# Altium footprint library 常用元件封装库.PcbLib: 1310 footprints (part 7 of 83)
Each footprint in its own frame and in the unit in brackets; x right, y up, seen from the top. Pads: shape width x height; smd on the part's side, far side on the other; paste and mask are expansions set on the pad; w line width, h text height; cw(c..) or ccw(c..) is an arc to the next point about the centre after c.
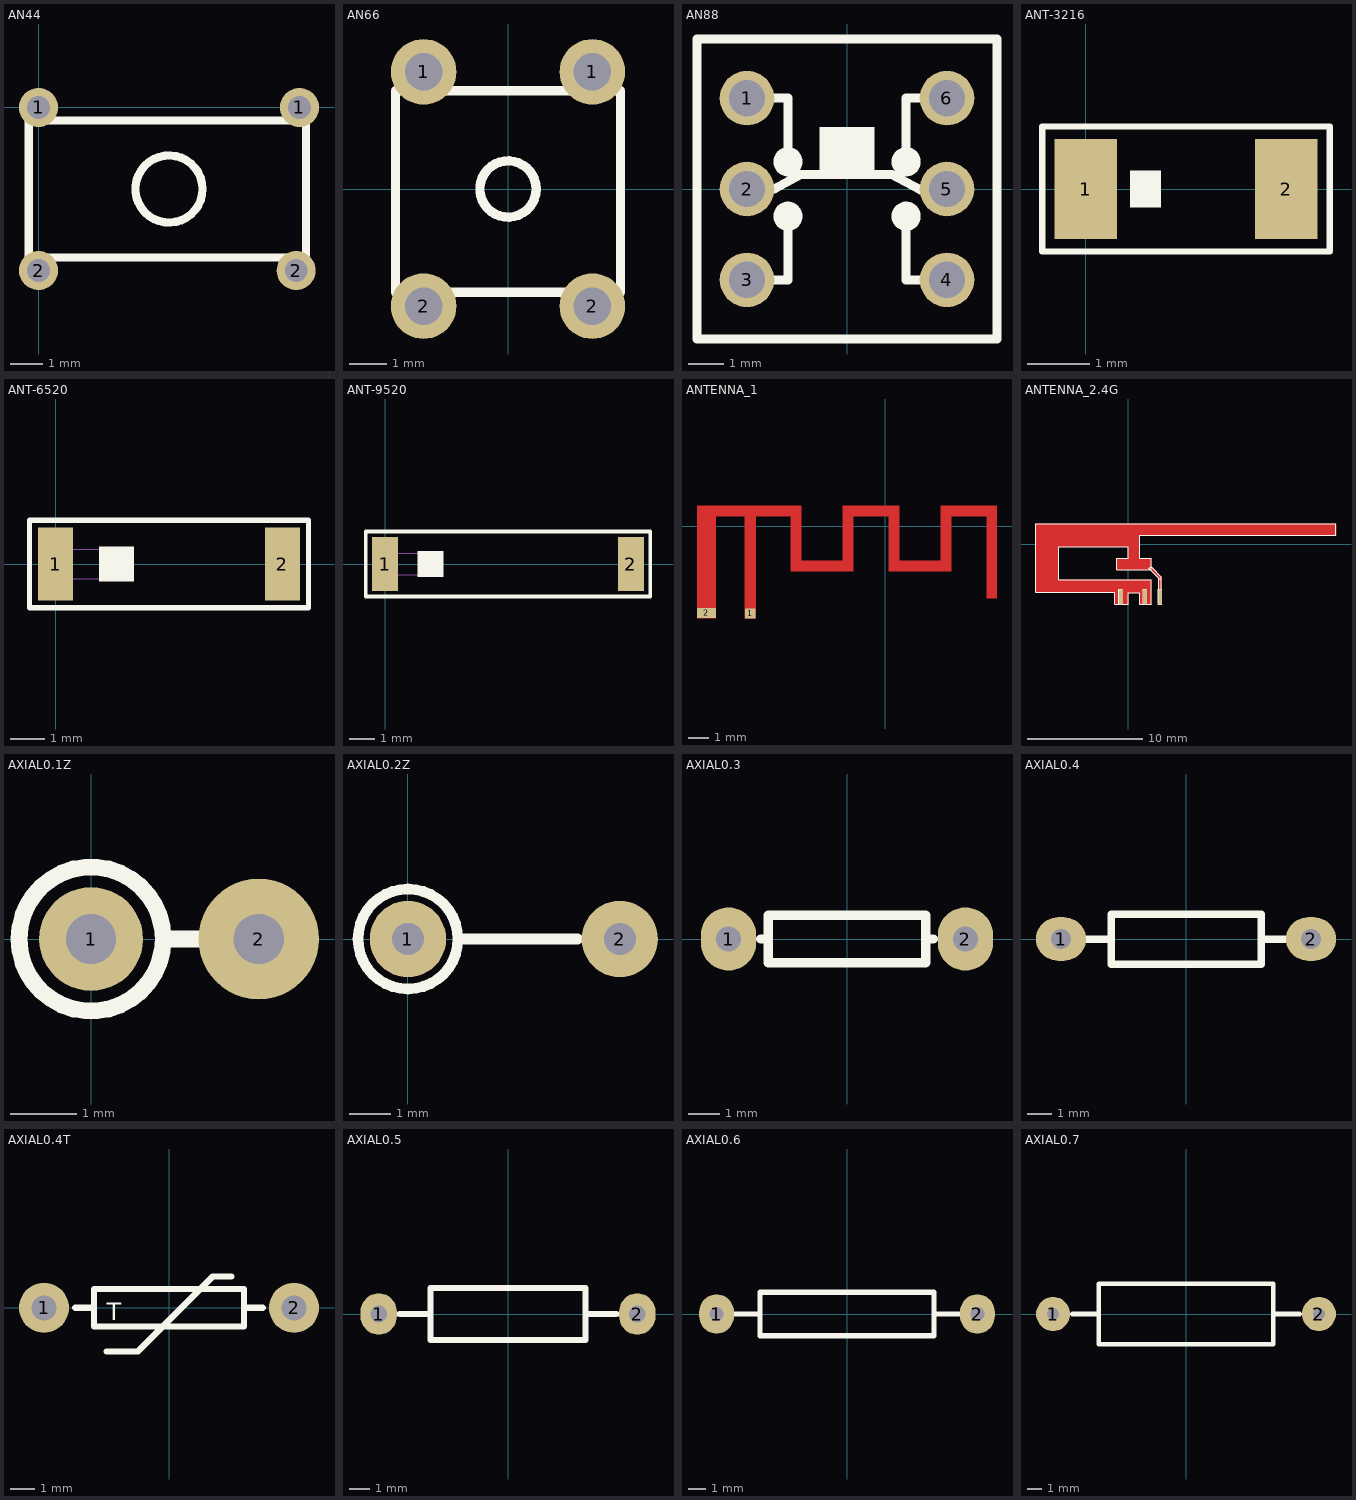
[diagram p6: the footprints below, top view; thin cyan lines are the x and y axes]

## AN44 [mm]
pads (4):
  round 1.2 hole 0.7: 1(0,0) 1(8,0) 2(0,-5) 2(7.9,-5)
Top Overlay:
  circle w0.254: c4,-2.5 r1.03
  lines w0.254: -0.3,-4.6 8.2,-4.6 8.2,-0.4 -0.3,-0.4 -0.3,-4.6

## AN66 [mil]
pads (4):
  round 70 hole 40: 1(-90,125) 1(90,125) 2(-90,-125) 2(90,-125)
Top Overlay:
  circle w10: c0,0 r30
  lines w10: -120,-110 120,-110 120,105 -120,105 -120,-110

## AN88 [mil]
pads (6):
  round 60 hole 40: 1(-110,100) 2(-110,0) 3(-110,-100) 4(110,-100) 5(110,0) 6(110,100)
Top Overlay:
  circle w18: c-65,-30 r7.07
  circle w18: c65,-30 r7.07
  circle w18: c65,30 r7.07
  circle w18: c-65,30 r7.07
  rectangle: -30,16 30,68
  lines w10: -110,-100 -65,-100 -65,-40 ; -110,0 -80,0 -51,16 49,16 81,-1 109,-1 110,0 ; -110,100 -65,100 -65,30 ; 65,-40 65,-100 110,-100 ; 65,40 65,100 110,100 ; -165,-165 165,-165 165,165 -165,165 -165,-165

## ANT-3216 [mm]
pads (2):
  rect 1x1.6 smd: 1(0,0) 2(3.2,0)
Top Overlay:
  rectangle: 0.7,-0.3 1.2,0.3
  lines w0.102: -0.7,-1 -0.7,1 3.9,1 3.9,-1 -0.7,-1

## ANT-6520 [mm]
pads (2):
  rect 1x2.1 smd: 1(0,0) 2(6.5,0)
Top Overlay:
  rectangle: 1.25,-0.5 2.25,0.5
  lines w0.152: -0.75,-1.25 -0.75,1.25 7.25,1.25 7.25,-1.25 -0.75,-1.25
Mechanical 2:
  lines w0.005: -0.432,-0.419 1.448,-0.419 1.448,0.419 -0.432,0.419 -0.432,-0.419

## ANT-9520 [mm]
pads (2):
  rect 1x2.1 smd: 1(0,0) 2(9.5,0)
Top Overlay:
  rectangle: 1.25,-0.5 2.25,0.5
  lines w0.152: -0.75,-1.25 10.25,-1.25 10.25,1.25 -0.75,1.25 -0.75,-1.25
Mechanical 2:
  lines w0.005: -0.432,-0.419 -0.432,0.419 1.448,0.419 1.448,-0.419 -0.432,-0.419

## ANTENNA_1 [mm] "曲流型天线"
pads (2):
  rect 0.5x0.5 smd paste-0.237: 1(-6.477,-4.191)
  rect 0.9x0.5 smd paste-0.437 mask-0.437: 2(-8.583,-4.166)
Top Layer:
  region: -9.033,-4.416 -9.033,0.983 -4.033,0.983 -4.033,-1.653 -2.031,-1.653 -2.031,0.983 0.665,0.983 0.665,-1.658 2.669,-1.658 2.669,0.982 5.367,0.982 5.367,-3.453 4.868,-3.453 4.868,0.474 3.175,0.474 3.175,-2.155 0.16,-2.155 0.16,0.481 -1.529,0.481 -1.529,-2.158 -4.533,-2.158 -4.533,0.481 -6.223,0.481 -6.223,-4.416 -6.733,-4.416 -6.733,0.483 -8.128,0.483 -8.128,-4.416
  region: -2.033,0.484 0.667,0.484 0.667,0.984 -2.033,0.984
  region: -9.033,0.484 -4.033,0.484 -4.033,0.984 -9.033,0.984
  region: 2.667,0.484 5.367,0.484 5.367,0.984 2.667,0.984
  region: -4.533,-2.156 -4.033,-2.156 -4.033,0.51 -4.533,0.51
  region: -4.033,-2.156 -2.033,-2.156 -2.033,-1.651 -4.033,-1.651
  region: -2.033,-2.156 -1.533,-2.156 -1.533,0.51 -2.033,0.51
  region: 2.667,-2.156 3.167,-2.156 3.167,0.51 2.667,0.51
  region: 0.667,-2.156 2.667,-2.156 2.667,-1.651 0.667,-1.651
  region: 0.167,-2.156 0.667,-2.156 0.667,0.51 0.167,0.51
  region: 4.867,-3.456 5.367,-3.456 5.367,0.51 4.867,0.51
  region: -6.733,-4.416 -6.233,-4.416 -6.233,0.51 -6.733,0.51
  region: -9.033,-4.416 -8.133,-4.416 -8.133,0.51 -9.033,0.51

## ANTENNA_2.4G [mil]
pads (3):
  rect 11.81x51.18 smd: 1(108,-180) 2(57,-180) 3(-26,-180)
Top Layer:
  region: 70.47,-84.37 101.61,-115.51 102.64,-118.19 102.76,-118.62 102.76,-205.79 113.23,-205.79 113.23,-112.95 77.56,-77.28
  region: -0.79,-205.51 -46.1,-205.51 -46.1,-163.78 -315.08,-163.78 -315.08,69.96 707.8,69.96 707.8,30.59 38.5,30.59 38.5,-47.99 77.83,-47.99 77.83,-87.36 -40.24,-87.36 -40.24,-48.19 -0.91,-48.19 -0.91,-8.82 -237.09,-8.82 -237.09,-121.61 77.8,-121.61 77.8,-205.63 38.54,-205.63 38.54,-166.3 -0.79,-166.3
Top Overlay:
  lines w1: -315.16,-163.63 -315.16,69.96 707.76,69.96 707.76,30.59 38.47,30.59 38.47,-48.15 77.84,-48.15 77.84,-87.52 -40.27,-87.52 -40.27,-48.15 -0.9,-48.15 -0.9,-8.78 -237.12,-8.78 -237.12,-121.63 77.84,-121.63 77.84,-205.63 38.47,-205.63 38.47,-166.26 -0.9,-166.26 -0.9,-205.63 -46.16,-205.63 -46.16,-163.63 -315.16,-163.63 ; -32.15,-205.22 -20.33,-205.22 -20.33,-154.04 -32.15,-154.04 -32.15,-205.22 ; 50.85,-205.22 62.67,-205.22 62.67,-154.04 50.85,-154.04 50.85,-205.22 ; 68.76,-82.63 77.76,-77.63 112.76,-112.63 112.76,-118.63 102.76,-118.63 101.76,-115.63 68.76,-82.63 ; 101.85,-205.22 113.67,-205.22 113.67,-154.04 101.85,-154.04 101.85,-205.22 ; 102.76,-205.63 102.76,-118.11 112.76,-118.11 112.76,-205.63 102.76,-205.63

## AXIAL0.1Z [mil]
pads (2):
  round 62 hole 30: 1(0,0)
  round 72 hole 30: 2(100,0)
Top Overlay:
  circle w10: c0,0 r43.01
  lines w10: 45,0 70,0

## AXIAL0.2Z [mil]
pads (2):
  round 72 hole 30: 1(0,0) 2(200,0)
Top Overlay:
  circle w10: c0,0 r47.17
  lines w10: 50,0 160,0

## AXIAL0.3 [mil]
pads (2):
  oval 70x80 hole 32: 1(-150,0) 2(150,0)
Top Overlay:
  lines w12: -109,0 -100,0 ; 109,0 100,0 ; 100,0 100,30 -100,30 -100,-30 100,-30 100,0

## AXIAL0.4 [mil]
pads (2):
  oval 80x70 hole 32: 1(-200,0) 2(200,0)
Top Overlay:
  lines w12: -160,0 -120,0 ; 120,0 160,0 ; -120,-40 120,-40 120,40 -120,40 -120,-40

## AXIAL0.4T [mil]
pads (2):
  round 80 hole 40: 1(-200,0) 2(200,0)
Top Overlay:
  lines w10: -150,0 -120,0 ; -100,-70 -50,-70 70,50 100,50 ; 120,0 150,0 ; -120,-30 -120,30 120,30 120,-30 -120,-30
  text "T" at -100,-20 h28

## AXIAL0.5 [mil]
pads (2):
  oval 70x80 hole 32: 1(-250,0) 2(250,0)
Top Overlay:
  lines w12: -210,0 -150,0 ; 150,0 210,0 ; -150,-50 -150,50 150,50 150,-50 -150,-50

## AXIAL0.6 [mil]
pads (2):
  oval 80x90 hole 32: 1(-300,0) 2(300,0)
Top Overlay:
  lines w12: -260,0 -200,0 ; 200,0 260,0 ; -200,-50 200,-50 200,50 -200,50 -200,-50

## AXIAL0.7 [mil]
pads (2):
  round 90 hole 32: 1(-350,0) 2(350,0)
Top Overlay:
  lines w12: -300,0 -230,0 ; 230,0 300,0 ; -230,-80 230,-80 230,80 -230,80 -230,-80